# Altium footprint library alex_footprint.PcbLib: 262 footprints (part 14 of 17)
Each footprint in its own frame and in the unit in brackets; x right, y up, seen from the top. Pads: shape width x height; smd on the part's side, far side on the other; paste and mask are expansions set on the pad; w line width, h text height; cw(c..) or ccw(c..) is an arc to the next point about the centre after c.
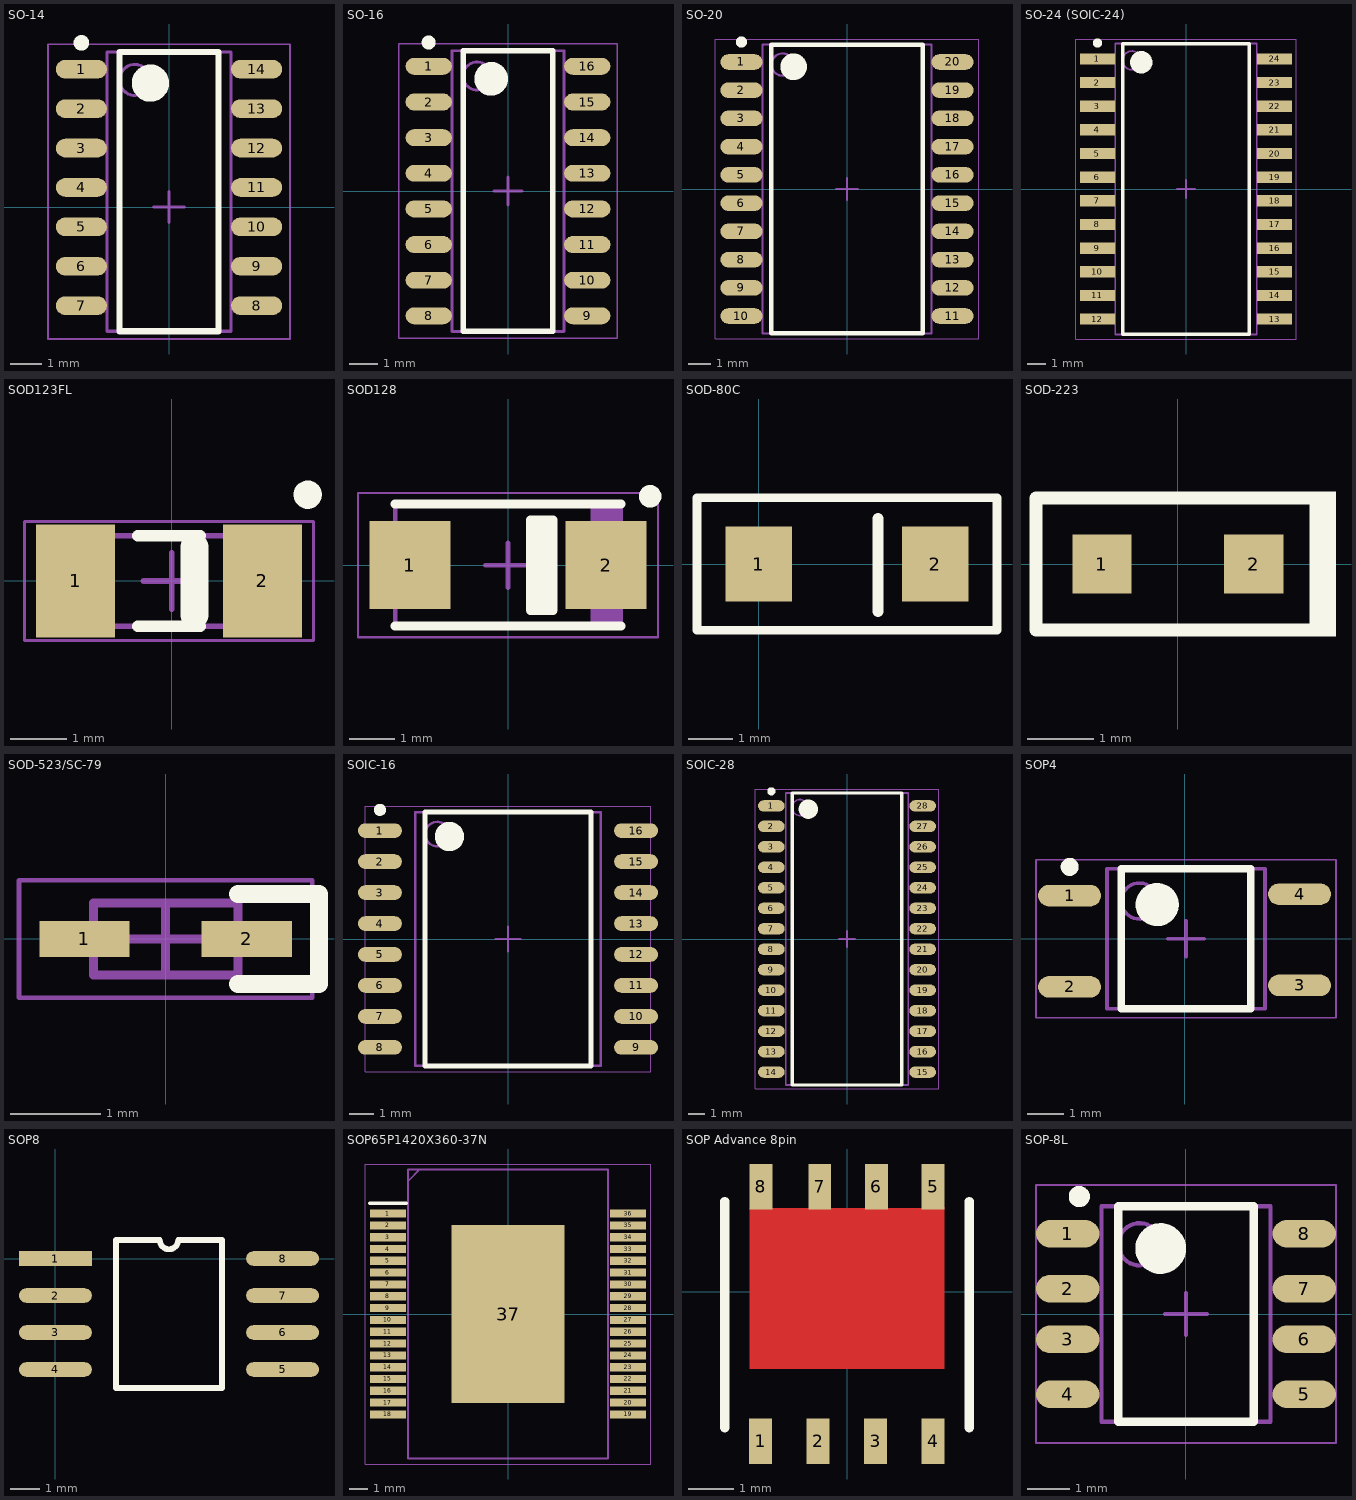
[diagram p13: the footprints below, top view; thin cyan lines are the x and y axes]

## SO-14 [mm]
height 1.75
pads (14):
  oval 1.65x0.6 smd: 1(-2.825,4.445) 2(-2.825,3.175) 3(-2.825,1.905) 4(-2.825,0.635) 5(-2.825,-0.635) 6(-2.825,-1.905) 7(-2.825,-3.175) 8(2.825,-3.175) 9(2.825,-1.905) 10(2.825,-0.635) 11(2.825,0.635) 12(2.825,1.905) 13(2.825,3.175) 14(2.825,4.445)
Top Overlay:
  circle w0.6: c-0.6,4 r0.3
  circle w0.25: c-2.825,5.295 r0.125
  lines w0.2: -1.6,-4 1.6,-4 1.6,5 -1.6,5 -1.6,-4
Mechanical 13:
  circle w0.1: c-1.1,4.1 r0.5
  lines w0.1: -2,-4 2,-4 2,5 -2,5 -2,-4
Mechanical 15:
  lines w0.05: -3.9,-4.25 3.9,-4.25 3.9,5.25 -3.9,5.25 -3.9,-4.25
  lines w0.1: -0.5,0 0.5,0 ; 0,-0.5 0,0.5
3D body: height 1.75, standoff 0.1, extent -2,-4 2,5

## SO-16 [mm]
height 1.75
pads (16):
  oval 1.65x0.6 smd: 1(-2.825,4.445) 2(-2.825,3.175) 3(-2.825,1.905) 4(-2.825,0.635) 5(-2.825,-0.635) 6(-2.825,-1.905) 7(-2.825,-3.175) 8(-2.825,-4.445) 9(2.825,-4.445) 10(2.825,-3.175) 11(2.825,-1.905) 12(2.825,-0.635) 13(2.825,0.635) 14(2.825,1.905) 15(2.825,3.175) 16(2.825,4.445)
Top Overlay:
  circle w0.6: c-0.6,4 r0.3
  circle w0.25: c-2.825,5.295 r0.125
  lines w0.2: -1.6,-5 1.6,-5 1.6,5 -1.6,5 -1.6,-5
Mechanical 13:
  circle w0.1: c-1.1,4.1 r0.5
  lines w0.1: -2,-5 2,-5 2,5 -2,5 -2,-5
Mechanical 15:
  lines w0.05: -3.9,-5.25 3.9,-5.25 3.9,5.25 -3.9,5.25 -3.9,-5.25
  lines w0.1: -0.5,0 0.5,0 ; 0,-0.5 0,0.5
3D body: height 1.75, standoff 0.1, extent -2,-5 2,5

## SO-20 [mm]
height 2.65
pads (20):
  oval 1.9x0.7 smd: 1(-4.75,5.715) 2(-4.75,4.445) 3(-4.75,3.175) 4(-4.75,1.905) 5(-4.75,0.635) 6(-4.75,-0.635) 7(-4.75,-1.905) 8(-4.75,-3.175) 9(-4.75,-4.445) 10(-4.75,-5.715) 11(4.75,-5.715) 12(4.75,-4.445) 13(4.75,-3.175) 14(4.75,-1.905) 15(4.75,-0.635) 16(4.75,0.635) 17(4.75,1.905) 18(4.75,3.175) 19(4.75,4.445) 20(4.75,5.715)
Top Overlay:
  circle w0.6: c-2.4,5.5 r0.3
  circle w0.25: c-4.75,6.615 r0.125
  lines w0.2: -3.4,-6.5 3.4,-6.5 3.4,6.5 -3.4,6.5 -3.4,-6.5
Mechanical 13:
  circle w0.1: c-2.9,5.6 r0.5
  lines w0.1: -3.8,-6.5 3.8,-6.5 3.8,6.5 -3.8,6.5 -3.8,-6.5
Mechanical 15:
  lines w0.05: -5.925,-6.75 5.925,-6.75 5.925,6.75 -5.925,6.75 -5.925,-6.75
  lines w0.1: -0.5,0 0.5,0 ; 0,-0.5 0,0.5
3D body: height 2.65, standoff 0.2, extent -3.8,-6.5 3.8,6.5

## SO-24 (SOIC-24) [mm]
height 2.65
pads (24):
  rect 1.9x0.6 smd: 1(-4.75,6.985) 2(-4.75,5.715) 3(-4.75,4.445) 4(-4.75,3.175) 5(-4.75,1.905) 6(-4.75,0.635) 7(-4.75,-0.635) 8(-4.75,-1.905) 9(-4.75,-3.175) 10(-4.75,-4.445) 11(-4.75,-5.715) 12(-4.75,-6.985) 13(4.75,-6.985) 14(4.75,-5.715) 15(4.75,-4.445) 16(4.75,-3.175) 17(4.75,-1.905) 18(4.75,-0.635) 19(4.75,0.635) 20(4.75,1.905) 21(4.75,3.175) 22(4.75,4.445) 23(4.75,5.715) 24(4.75,6.985)
Top Overlay:
  circle w0.25: c-4.75,7.835 r0.125
  circle w0.6: c-2.4,6.8 r0.3
  lines w0.2: -3.4,-7.8 -3.4,7.8 3.4,7.8 3.4,-7.8 -3.4,-7.8
Mechanical 13:
  circle w0.1: c-2.9,6.9 r0.5
  lines w0.1: -3.8,-7.8 -3.8,7.8 3.8,7.8 3.8,-7.8 -3.8,-7.8
Mechanical 15:
  lines w0.05: -5.925,-8.05 -5.925,8.05 5.925,8.05 5.925,-8.05 -5.925,-8.05
  lines w0.1: -0.5,0 0.5,0 ; 0,-0.5 0,0.5
3D body: height 2.65, standoff 0.1, extent -3.8,-7.8 3.8,7.8

## SOD123FL [mm]
height 1.25
pads (2):
  rect 1.4x2 smd: 1(-1.7,0) 2(1.6,0)
Top Overlay:
  circle w0.25: c2.4,1.525 r0.125
  lines w0.2: -0.6,-0.8 0.5,-0.8 ; -0.6,0.8 0.5,0.8
  lines w0.5: 0.4,-0.6 0.4,0.6
Mechanical 13:
  rectangle: 1.279,-0.8 1.75,0.8
  lines w0.1: -1.75,-0.8 1.75,-0.8 1.75,0.8 -1.75,0.8 -1.75,-0.8
Mechanical 15:
  lines w0.05: -2.6,-1.05 2.5,-1.05 2.5,1.05 -2.6,1.05 -2.6,-1.05
  lines w0.1: -0.5,0 0.5,0 ; 0,-0.5 0,0.5
3D body: height 1.25, standoff 0, extent -1.75,-0.8 1.75,0.8

## SOD128 [mm]
height 1.1
pads (2):
  rect 1.8x1.95 smd: 1(-2.175,0) 2(2.175,0)
Top Overlay:
  circle w0.25: c3.15,1.525 r0.125
  lines w0.2: -2.5,-1.35 2.5,-1.35 ; -2.5,1.35 2.5,1.35 ; 0.625,0.65 0.625,-0.875 0.625,0.875 0.625,-0.475 0.85,-0.7 ; 0.75,-1 0.75,1 ; 0.85,-0.9 0.85,-0.7 ; 0.85,-0.7 0.85,-0.2 1,-0.05 1,1 ; 0.85,-0.7 0.85,0.85 1,1 ; 1,1 0.5,1 0.5,-1 1,-1 1,1
Mechanical 13:
  rectangle: 1.827,-1.35 2.5,1.35
  lines w0.1: -2.5,-1.35 -2.5,1.35 2.5,1.35 2.5,-1.35 -2.5,-1.35
Mechanical 15:
  lines w0.05: -3.325,-1.6 -3.325,1.6 3.325,1.6 3.325,-1.6 -3.325,-1.6
  lines w0.1: -0.5,0 0.5,0 ; 0,-0.5 0,0.5
3D body: height 1.1, standoff 0, extent -2.5,-1.35 2.5,1.35

## SOD-80C [mm]
pads (2):
  rect 1.5x1.7 smd: 1(0,0) 2(4,0)
Top Overlay:
  lines w0.2: -1.4,-1.5 -1.4,-1 -1.4,1.5 5.4,1.5 5.4,-1.5 -1.4,-1.5
  lines w0.254: 2.7,-1.075 2.7,1.025

## SOD-223 [mm]
pads (2):
  rect 0.9x0.9 smd: 1(-1.15,0) 2(1.15,0)
Top Overlay:
  rectangle: 2.1,-1.1 2.4,1.1
  lines w0.2: -2.15,-1 -2.15,-0.1 -2.15,1 0.563,1 2.1,1 ; -2.1,-1 2.1,-1 ; 2.1,-1 2.1,1 ; 2.1,-1 2.1,1

## SOD-523/SC-79 [mm]
height 0.6
pads (2):
  rect 1x0.4 smd: 1(-0.9,0) 2(0.9,0)
Top Overlay:
  lines w0.2: 0.8,-0.5 1.7,-0.5 1.7,0.5 0.8,0.5
Mechanical 13:
  lines w0.1: -0.8,-0.4 0.8,-0.4 0.8,0.4 -0.8,0.4 -0.8,-0.4
Mechanical 15:
  lines w0.05: -1.625,-0.65 1.625,-0.65 1.625,0.65 -1.625,0.65 -1.625,-0.65
  lines w0.1: -0.4,0 0.4,0 ; 0,-0.4 0,0.4
3D body: height 0.6, standoff 0, extent -0.8,-0.4 0.8,0.4

## SOIC-16 [mm]
height 2.65
pads (16):
  oval 1.8x0.6 smd: 1(-5.25,4.445) 2(-5.25,3.175) 3(-5.25,1.905) 4(-5.25,0.635) 5(-5.25,-0.635) 6(-5.25,-1.905) 7(-5.25,-3.175) 8(-5.25,-4.445) 9(5.25,-4.445) 10(5.25,-3.175) 11(5.25,-1.905) 12(5.25,-0.635) 13(5.25,0.635) 14(5.25,1.905) 15(5.25,3.175) 16(5.25,4.445)
Top Overlay:
  circle w0.25: c-5.25,5.295 r0.125
  circle w0.6: c-2.4,4.2 r0.3
  lines w0.2: -3.4,-5.2 -3.4,5.2 3.4,5.2 3.4,-5.2 -3.4,-5.2
Mechanical 13:
  circle w0.1: c-2.9,4.3 r0.5
  lines w0.1: -3.8,-5.2 -3.8,5.2 3.8,5.2 3.8,-5.2 -3.8,-5.2
Mechanical 15:
  lines w0.05: -5.85,-5.45 -5.85,5.45 5.85,5.45 5.85,-5.45 -5.85,-5.45
  lines w0.1: -0.5,0 0.5,0 ; 0,-0.5 0,0.5
3D body: height 2.65, standoff 0.1, extent -3.8,-5.2 3.8,5.2

## SOIC-28 [mm]
height 2.65
pads (28):
  oval 1.65x0.7 smd: 1(-4.69,8.255) 2(-4.69,6.985) 3(-4.69,5.715) 4(-4.69,4.445) 5(-4.69,3.175) 6(-4.69,1.905) 7(-4.69,0.635) 8(-4.69,-0.635) 9(-4.69,-1.905) 10(-4.69,-3.175) 11(-4.69,-4.445) 12(-4.69,-5.715) 13(-4.69,-6.985) 14(-4.69,-8.255) 15(4.69,-8.255) 16(4.69,-6.985) 17(4.69,-5.715) 18(4.69,-4.445) 19(4.69,-3.175) 20(4.69,-1.905) 21(4.69,-0.635) 22(4.69,0.635) 23(4.69,1.905) 24(4.69,3.175) 25(4.69,4.445) 26(4.69,5.715) 27(4.69,6.985) 28(4.69,8.255)
Top Overlay:
  circle w0.6: c-2.4,8.05 r0.3
  circle w0.25: c-4.69,9.155 r0.125
  lines w0.2: -3.4,-9.05 3.4,-9.05 3.4,9.05 -3.4,9.05 -3.4,-9.05
Mechanical 13:
  circle w0.1: c-2.9,8.15 r0.5
  lines w0.1: -3.8,-9.05 3.8,-9.05 3.8,9.05 -3.8,9.05 -3.8,-9.05
Mechanical 15:
  lines w0.05: -5.675,-9.3 5.675,-9.3 5.675,9.3 -5.675,9.3 -5.675,-9.3
  lines w0.1: -0.5,0 0.5,0 ; 0,-0.5 0,0.5
3D body: height 2.65, standoff 0.3, extent -3.8,-9.05 3.8,9.05

## SOP4 [mm]
height 2
pads (4):
  oval 1.75x0.6 smd: 1(-3.2,1.2) 2(-3.2,-1.34) 3(3.2,-1.3) 4(3.2,1.24)
Top Overlay:
  circle w0.25: c-3.2,2 r0.125
  circle w0.6: c-0.76,0.95 r0.3
  lines w0.2: -1.76,-1.95 -1.76,1.95 1.84,1.95 1.84,-1.95 -1.76,-1.95
Mechanical 13:
  circle w0.1: c-1.26,1.05 r0.5
  lines w0.1: -2.16,-1.95 -2.16,1.95 2.24,1.95 2.24,-1.95 -2.16,-1.95
Mechanical 15:
  lines w0.05: -4.135,-2.2 -4.135,2.2 4.215,2.2 4.215,-2.2 -4.135,-2.2
  lines w0.1: -0.46,0 0.54,0 ; 0.04,-0.5 0.04,0.5
3D body: height 2, standoff 0.1, extent -2.16,-1.95 2.24,1.95

## SOP8 [mm]
pads (8):
  rect 2.5x0.5 smd: 1(0,0)
  oval 2.5x0.5 smd: 2(0,-1.27) 3(0,-2.54) 4(0,-3.81) 5(7.8,-3.81) 6(7.8,-2.54) 7(7.8,-1.27) 8(7.8,0)
Top Overlay:
  lines w0.2: 2.085,-4.445 5.715,-4.445 5.715,0.635 4.217,0.635 cw(c3.9,0.635) 3.582,0.635 2.085,0.635 2.085,-4.445

## SOP65P1420X360-37N [mm]
pads (37):
  rect 2x0.45 smd: 1(-6.6,5.525) 2(-6.6,4.875) 3(-6.6,4.225) 4(-6.6,3.575) 5(-6.6,2.925) 6(-6.6,2.275) 7(-6.6,1.625) 8(-6.6,0.975) 9(-6.6,0.325) 10(-6.6,-0.325) 11(-6.6,-0.975) 12(-6.6,-1.625) 13(-6.6,-2.275) 14(-6.6,-2.925) 15(-6.6,-3.575) 16(-6.6,-4.225) 17(-6.6,-4.875) 18(-6.6,-5.525) 19(6.6,-5.525) 20(6.6,-4.875) 21(6.6,-4.225) 22(6.6,-3.575) 23(6.6,-2.925) 24(6.6,-2.275) 25(6.6,-1.625) 26(6.6,-0.975) 27(6.6,-0.325) 28(6.6,0.325) 29(6.6,0.975) 30(6.6,1.625) 31(6.6,2.275) 32(6.6,2.925) 33(6.6,3.575) 34(6.6,4.225) 35(6.6,4.875) 36(6.6,5.525)
  rect 6.2x9.8 smd: 37(0,0)
Top Overlay:
  lines w0.2: -7.6,6.1 -5.6,6.1
Mechanical 15:
  lines w0.1: -5.5,7.3 -4.85,7.95 ; -5.5,-7.95 -5.5,7.95 5.5,7.95 5.5,-7.95 -5.5,-7.95
Mechanical 20:
  lines w0.05: -7.85,-8.25 -7.85,8.25 7.85,8.25 7.85,-8.25 -7.85,-8.25
3D body "VN808-E.stp": height 3.6, standoff 0, extent -7.1,-7.95 7.1,7.95

## SOP Advance 8pin [mm]
pads (8):
  rect 0.5x1 smd mask+0.25: 1(-1.91,-3.3) 2(-0.64,-3.3) 3(0.63,-3.3) 4(1.9,-3.3) 5(1.9,2.325) 6(0.65,2.325) 7(-0.6,2.325) 8(-1.9,2.325)
Top Layer:
  region: -2.15,1.85 2.125,1.85 2.15,1.875 2.15,-1.7 -2.15,-1.7
Top Overlay:
  lines w0.2: -2.7,-3 -2.7,-1 -2.7,2 ; 2.7,-3 2.7,2

## SOP-8L [mm]
height 1.73
pads (8):
  oval 1.5x0.65 smd: 1(-2.8,1.9) 2(-2.8,0.6) 3(-2.8,-0.6) 4(-2.8,-1.9) 5(2.8,-1.9) 6(2.8,-0.6) 7(2.8,0.6) 8(2.8,1.9)
Top Overlay:
  circle w0.25: c-2.525,2.78 r0.125
  circle w0.6: c-0.6,1.55 r0.3
  lines w0.2: -1.6,-2.55 -1.6,2.55 1.6,2.55 1.6,-2.55 -1.6,-2.55
Mechanical 13:
  circle w0.1: c-1.1,1.65 r0.5
  lines w0.1: -2,-2.55 -2,2.55 2,2.55 2,-2.55 -2,-2.55
Mechanical 15:
  lines w0.05: -3.55,-3.05 -3.55,3.05 3.55,3.05 3.55,-3.05 -3.55,-3.05
  lines w0.1: -0.5,0 0.5,0 ; 0,-0.5 0,0.5
3D body: height 1.73, standoff 0.25, extent -2,-2.55 2,2.55